# Altium integrated library RL2.IntLib: 663 symbols (part 3 of 4) (continued)
## AD9244 (continued)

## ADA4661-2ARMZ
designator *
footprint MSOP8
part A pins: 1 OUT (out), 2 - (in), 3 + (in), 4 V- (power), 8 V+ (power)
part B pins: 5 + (in), 6 - (in), 7 OUT (out)

## ADCS7476AIMF
designator DD?
1MSPS, 12-/10-/8-Bit A/D Converters in SOT-23 & WSON
footprint SOT23-6  (SOT457) (SC-74)
pins: 1 VDD (power), 2 GND (in), 3 VIN (in), 4 SCK (out), 5 SDO (in), 6 ~{CS} (power)

## ADG604TRU
designator DA?
Part Field 1: *; Part Field 2: *
footprint TSSOP14 (JEDEC MO-153)
pins: 1 A0, 2 EN, 3 VSS, 4 IN0, 5 IN1, 6 OUT, 10 IN3, 11 IN2, 12 VDD, 13 GND, 14 A1
text: MUX

## ADG608TRU
designator DA?
Part Field 1: *; Part Field 2: *
footprint TSSOP16 (JEDEC MO-153)
pins: 1 A0, 2 EN, 3 VSS, 4 IN0, 5 IN1, 6 IN2, 7 IN3, 8 OUT, 9 IN7, 10 IN6, 11 IN5, 12 IN4, 13 VDD, 14 GND, 15 A2, 16 A1
text: MUX

## ADG1421BRMZ
designator DA?
2.1 Ω On Resistance, ±15 V/+12 V/±5 V iCMOS Dual SPST Switches; Part Field 1: *; Part Field 2: *
footprint MSOP10 (MO-187-BA)
pins: 1 S1 (io), 2 S2 (io), 4 GND (power), 5 VDD (power), 6 IN2 (power), 7 IN1 (power), 8 VSS (power), 9 D2 (power), 10 D1 (power)
text: SPST

## ADG1439BRUZ
designator DA?
Serially Controlled, ±15 V/+12 V/±5 V, 4-Channel, iCMOS Multiplexers/Matrix Switches
footprint TSSOP20 (JEDEC MO-153)
pins: 1 SCLK (in), 2 VDD (in), 3 DIN (power), 4 GND (in), 6 S1A (power), 7 S2A (out), 8 S3A (out), 9 S4A (power), 10 DA (power), 11 DB (out), 12 S4B (out), 13 S3B (power), 14 S2B (out), 15 S1B (out), 16 VSS (power), 17 ~{RESET} (out), 18 SDO (in), 19 VL (io), 20 ~{SYNC} (out)

## ADG1606BCPZ
designator DA?
4.5 Om RON, 16-Channel, ±5 V,+12 V,+5 V, and +3.3 V Multiplexer; Part Field 1: *; Part Field 2: *
footprint LFCSP32 (CP-32-2) MO-220-VHHD-2
pins: 1 IN15, 2 IN14, 3 IN13, 4 IN12, 5 IN11, 6 IN10, 7 IN9, 8 IN8, 9 GND, 10 A3, 11 A2, 14 A1, 15 A0, 16 EN, 17 IN0, 18 IN1, 19 IN2, 20 IN3, 21 IN4, 22 IN5, 23 IN6, 24 IN7, 25 VSS, 29 OUT, 31 VDD, 33 PAD
text: MUX

## ADG2188
designator DA?, comment ADG2188BCPZ
I 2C® CMOS 8 × 8 Unbuffered Analog / Switch Array with Dual/Single Supplies
footprint LFCSP32 (CP-32-7) MO-220-WHHD
pins: 1 VSS, 3 X0, 4 X1, 5 X2, 6 X3, 7 X4, 8 X5, 9 Y0, 10 Y1, 11 Y2, 12 Y3, 13 Y4, 14 Y5, 15 Y6, 16 Y7, 17 X6, 18 X7, 24 VDD, 25 VL, 26 SDA, 27 SCL, 28 A0, 29 A1, 30 A2, 31 ~{RESET}, 32 GND, 33 PAD
text: ADC

## ADM809-5SART
designator DD?
footprint SOT-23
pins: 1 GND (in), 2 ~{RST} (in), 3 VCC (in)

## ADR435BR
designator DA?, comment ADR435BRZ
footprint SOIC8 JEDEC
pins: 2 VIN (in), 4 GND (power), 5 TRIM (power), 6 VOUT (power)

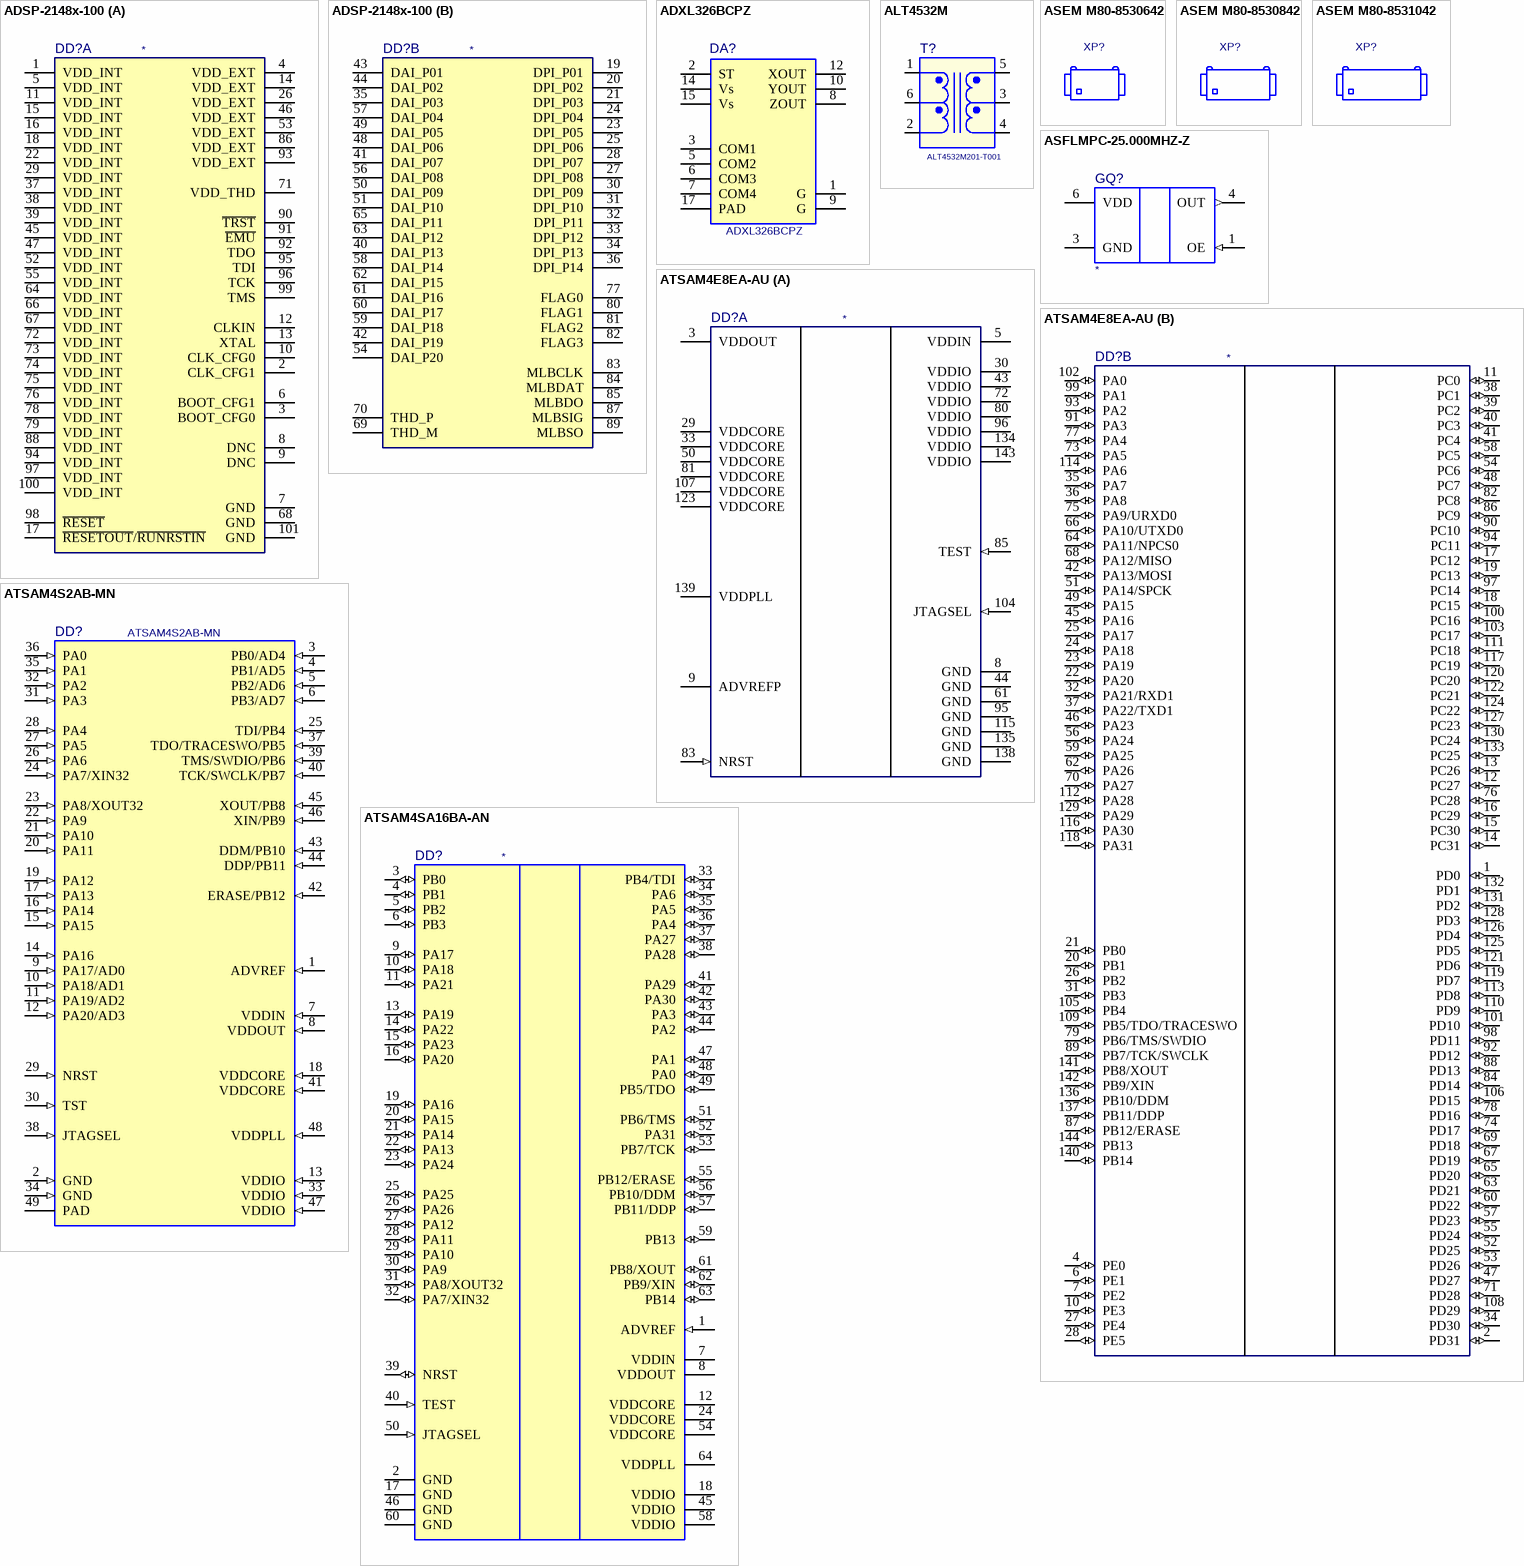
[diagram p23: symbols ADSP-2148x-100 to ATSAM4SA16BA-AN]

## ADSP-2148x-100
designator DD?
footprint LQFP100-25
part A pins: 1 VDD_INT (power), 2 CLK_CFG1 (power), 3 BOOT_CFG0 (power), 4 VDD_EXT (power), 5 VDD_INT (power), 6 BOOT_CFG1 (power), 7 GND (power), 8 DNC (power), 9 DNC (power), 10 CLK_CFG0 (power), 11 VDD_INT (power), 12 CLKIN (power), 13 XTAL (power), 14 VDD_EXT (power), 15 VDD_INT (power), 16 VDD_INT (power), 17 ~{RESETOUT}/~{RUNRSTIN} (power), 18 VDD_INT (power), 22 VDD_INT (power), 26 VDD_EXT (power), 29 VDD_INT (power), 37 VDD_INT (power), 38 VDD_INT (power), 39 VDD_INT (power), 45 VDD_INT (power), 46 VDD_EXT (power), 47 VDD_INT (power), 52 VDD_INT (power), 53 VDD_EXT (power), 55 VDD_INT (power), 64 VDD_INT (power), 66 VDD_INT (power), 67 VDD_INT (power), 68 GND (power), 71 VDD_THD (power), 72 VDD_INT (power), 73 VDD_INT (power), 74 VDD_INT (power), 75 VDD_INT (power), 76 VDD_INT (power), 78 VDD_INT (power), 79 VDD_INT (power), 86 VDD_EXT (power), 88 VDD_INT (power), 90 ~{TRST} (power), 91 ~{EMU} (power), 92 TDO (power), 93 VDD_EXT (power), 94 VDD_INT (power), 95 TDI (power), 96 TCK (power), 97 VDD_INT (power), 98 ~{RESET} (power), 99 TMS (power), 100 VDD_INT (power), 101 GND (power)
part B pins: 19 DPI_P01 (power), 20 DPI_P02 (power), 21 DPI_P03 (power), 23 DPI_P05 (power), 24 DPI_P04 (power), 25 DPI_P06 (power), 27 DPI_P08 (power), 28 DPI_P07 (power), 30 DPI_P09 (power), 31 DPI_P10 (power), 32 DPI_P11 (power), 33 DPI_P12 (power), 34 DPI_P13 (power), 35 DAI_P03 (power), 36 DPI_P14 (power), 40 DAI_P13 (power), 41 DAI_P07 (power), 42 DAI_P19 (power), 43 DAI_P01 (power), 44 DAI_P02 (power), 48 DAI_P06 (power), 49 DAI_P05 (power), 50 DAI_P09 (power), 51 DAI_P10 (power), 54 DAI_P20 (power), 56 DAI_P08 (power), 57 DAI_P04 (power), 58 DAI_P14 (power), 59 DAI_P18 (power), 60 DAI_P17 (power), 61 DAI_P16 (power), 62 DAI_P15 (power), 63 DAI_P12 (power), 65 DAI_P11 (power), 69 THD_M (power), 70 THD_P (power), 77 FLAG0 (power), 80 FLAG1 (power), 81 FLAG2 (power), 82 FLAG3 (power), 83 MLBCLK (power), 84 MLBDAT (power), 85 MLBDO (power), 87 MLBSIG (power), 89 MLBSO (power)
1 alternate drawing of the same symbol

## ADXL326BCPZ
designator DA?
Small, Low Power, 3-Axis ±16 g Accelerometer; Part Field 1: *; Part Field 2: *
footprint LFCSP16 (CP-16-5a)
pins: 1 G, 2 ST, 3 COM1, 5 COM2, 6 COM3, 7 COM4, 8 ZOUT, 9 G, 10 YOUT, 12 XOUT, 14 Vs, 15 Vs, 17 PAD

## ALT4532M
designator T?, comment ALT4532M201-T001
footprint ALT4532M
pins: 1 TD+, 2, 3, 4, 5, 6

## ASEM M80-8530642
designator XP?, comment M80-8530642 вилка на плату  (value not drawn)
M80-8530642; Value: *

## ASEM M80-8530842
designator XP?, comment M80-8530842 вилка на плату  (value not drawn)
M80-8530842; Value: *

## ASEM M80-8531042
designator XP?, comment M80-8531042 вилка на плату  (value not drawn)
M80-8531042; Value: *

## ASFLMPC-25.000MHZ-Z
designator GQ?
footprint ASFLMP
pins: 1 OE (in), 3 GND (power), 4 OUT (out), 6 VDD (power)

## ATSAM4E8EA-AU
designator DD?
footprint LQFP144
signal-integrity model sam4e8e_lqfp144.ibs
part A pins: 3 VDDOUT (power), 5 VDDIN (power), 8 GND (power), 9 ADVREFP (power), 29 VDDCORE (power), 30 VDDIO (power), 33 VDDCORE (power), 43 VDDIO (power), 44 GND (power), 50 VDDCORE (power), 61 GND (power), 72 VDDIO (power), 80 VDDIO (power), 81 VDDCORE (power), 83 NRST (in), 85 TEST (in), 95 GND (power), 96 VDDIO (power), 104 JTAGSEL (in), 107 VDDCORE (power), 115 GND (power), 123 VDDCORE (power), 134 VDDIO (power), 135 GND (power), 138 GND (power), 139 VDDPLL (power), 143 VDDIO (power)
part B pins: 1 PD0 (io), 2 PD31 (io), 4 PE0 (io), 6 PE1 (io), 7 PE2 (io), 10 PE3 (io), 11 PC0 (io), 12 PC27 (io), 13 PC26 (io), 14 PC31 (io), 15 PC30 (io), 16 PC29 (io), 17 PC12 (io), 18 PC15 (io), 19 PC13 (io), 20 PB1 (io), 21 PB0 (io), 22 PA20 (io), 23 PA19 (io), 24 PA18 (io), 25 PA17 (io), 26 PB2 (io), 27 PE4 (io), 28 PE5 (io), 31 PB3 (io), 32 PA21/RXD1 (io), 34 PD30 (io), 35 PA7 (io), 36 PA8 (io), 37 PA22/TXD1 (io), 38 PC1 (io), 39 PC2 (io), 40 PC3 (io), 41 PC4 (io), 42 PA13/MOSI (io), 45 PA16 (io), 46 PA23 (io), 47 PD27 (io), 48 PC7 (io), 49 PA15 (io), 51 PA14/SPCK (io), 52 PD25 (io), 53 PD26 (io), 54 PC6 (io), 55 PD24 (io), 56 PA24 (io), 57 PD23 (io), 58 PC5 (io), 59 PA25 (io), 60 PD22 (io), 62 PA26 (io), 63 PD21 (io), 64 PA11/NPCS0 (io), 65 PD20 (io), 66 PA10/UTXD0 (io), 67 PD19 (io), 68 PA12/MISO (io), 69 PD18 (io), 70 PA27 (io), 71 PD28 (io), 73 PA5 (io), 74 PD17 (io), 75 PA9/URXD0 (io), 76 PC28 (io), 77 PA4 (io), 78 PD16 (io), 79 PB6/TMS/SWDIO (io), 82 PC8 (io), 84 PD14 (io), 86 PC9 (io), 87 PB12/ERASE (io), 88 PD13 (io), 89 PB7/TCK/SWCLK (io), 90 PC10 (io), 91 PA3 (io), 92 PD12 (io), 93 PA2 (io), 94 PC11 (io), 97 PC14 (io), 98 PD11 (io), 99 PA1 (io), 100 PC16 (io), 101 PD10 (io), 102 PA0 (io), 103 PC17 (io), 105 PB4 (io), 106 PD15 (io), 108 PD29 (io), 109 PB5/TDO/TRACESWO (io), 110 PD9 (io), 111 PC18 (io), 112 PA28 (io), 113 PD8 (io), 114 PA6 (io), 116 PA30 (io), 117 PC19 (io), 118 PA31 (io), 119 PD7 (io), 120 PC20 (io), 121 PD6 (io), 122 PC21 (io), 124 PC22 (io), 125 PD5 (io), 126 PD4 (io), 127 PC23 (io), 128 PD3 (io), 129 PA29 (io), 130 PC24 (io), 131 PD2 (io), 132 PD1 (io), 133 PC25 (io), 136 PB10/DDM (io), 137 PB11/DDP (io), 140 PB14 (io), 141 PB8/XOUT (io), 142 PB9/XIN (io), 144 PB13 (io)

## ATSAM4S2AB-MN
designator DD?
footprint QFN48_5.8 (QFN, 64-Leads, Body 9x9mm, Pitch 0.5mm, Thermal Pad 7.3x7.3mm, IPC Low Density)
pins: 1 ADVREF (in), 2 GND (in), 3 PB0/AD4 (in), 4 PB1/AD5 (in), 5 PB2/AD6 (in), 6 PB3/AD7 (in), 7 VDDIN (in), 8 VDDOUT (in), 9 PA17/AD0 (in), 10 PA18/AD1 (in), 11 PA19/AD2 (in), 12 PA20/AD3 (in), 13 VDDIO (in), 14 PA16 (in), 15 PA15 (in), 16 PA14 (in), 17 PA13 (in), 18 VDDCORE (in), 19 PA12 (in), 20 PA11 (in), 21 PA10 (in), 22 PA9 (in), 23 PA8/XOUT32 (in), 24 PA7/XIN32 (in), 25 TDI/PB4 (in), 26 PA6 (in), 27 PA5 (in), 28 PA4 (in), 29 NRST (in), 30 TST (in), 31 PA3 (in), 32 PA2 (in), 33 VDDIO (in), 34 GND (in), 35 PA1 (in), 36 PA0 (in), 37 TDO/TRACESWO/PB5 (in), 38 JTAGSEL (in), 39 TMS/SWDIO/PB6 (in), 40 TCK/SWCLK/PB7 (in), 41 VDDCORE (in), 42 ERASE/PB12 (in), 43 DDM/PB10 (in), 44 DDP/PB11 (in), 45 XOUT/PB8 (in), 46 XIN/PB9 (in), 47 VDDIO (in), 48 VDDPLL (in), 49 PAD (power)

## ATSAM4SA16BA-AN
designator DD?
footprint LQFP64
pins: 1 ADVREF (in), 2 GND (power), 3 PB0 (io), 4 PB1 (io), 5 PB2 (io), 6 PB3 (io), 7 VDDIN (power), 8 VDDOUT (power), 9 PA17 (io), 10 PA18 (io), 11 PA21 (io), 12 VDDCORE (power), 13 PA19 (io), 14 PA22 (io), 15 PA23 (io), 16 PA20 (io), 17 GND (power), 18 VDDIO (power), 19 PA16 (io), 20 PA15 (io), 21 PA14 (io), 22 PA13 (io), 23 PA24 (io), 24 VDDCORE (power), 25 PA25 (io), 26 PA26 (io), 27 PA12 (io), 28 PA11 (io), 29 PA10 (io), 30 PA9 (io), 31 PA8/XOUT32 (io), 32 PA7/XIN32 (io), 33 PB4/TDI (io), 34 PA6 (io), 35 PA5 (io), 36 PA4 (io), 37 PA27 (io), 38 PA28 (io), 39 NRST (io), 40 TEST (in), 41 PA29 (io), 42 PA30 (io), 43 PA3 (io), 44 PA2 (io), 45 VDDIO (power), 46 GND (power), 47 PA1 (io), 48 PA0 (io), 49 PB5/TDO (io), 50 JTAGSEL (in), 51 PB6/TMS (io), 52 PA31 (io), 53 PB7/TCK (io), 54 VDDCORE (power), 55 PB12/ERASE (io), 56 PB10/DDM (io), 57 PB11/DDP (io), 58 VDDIO (power), 59 PB13 (io), 60 GND (power), 61 PB8/XOUT (io), 62 PB9/XIN (io), 63 PB14 (io), 64 VDDPLL (power)

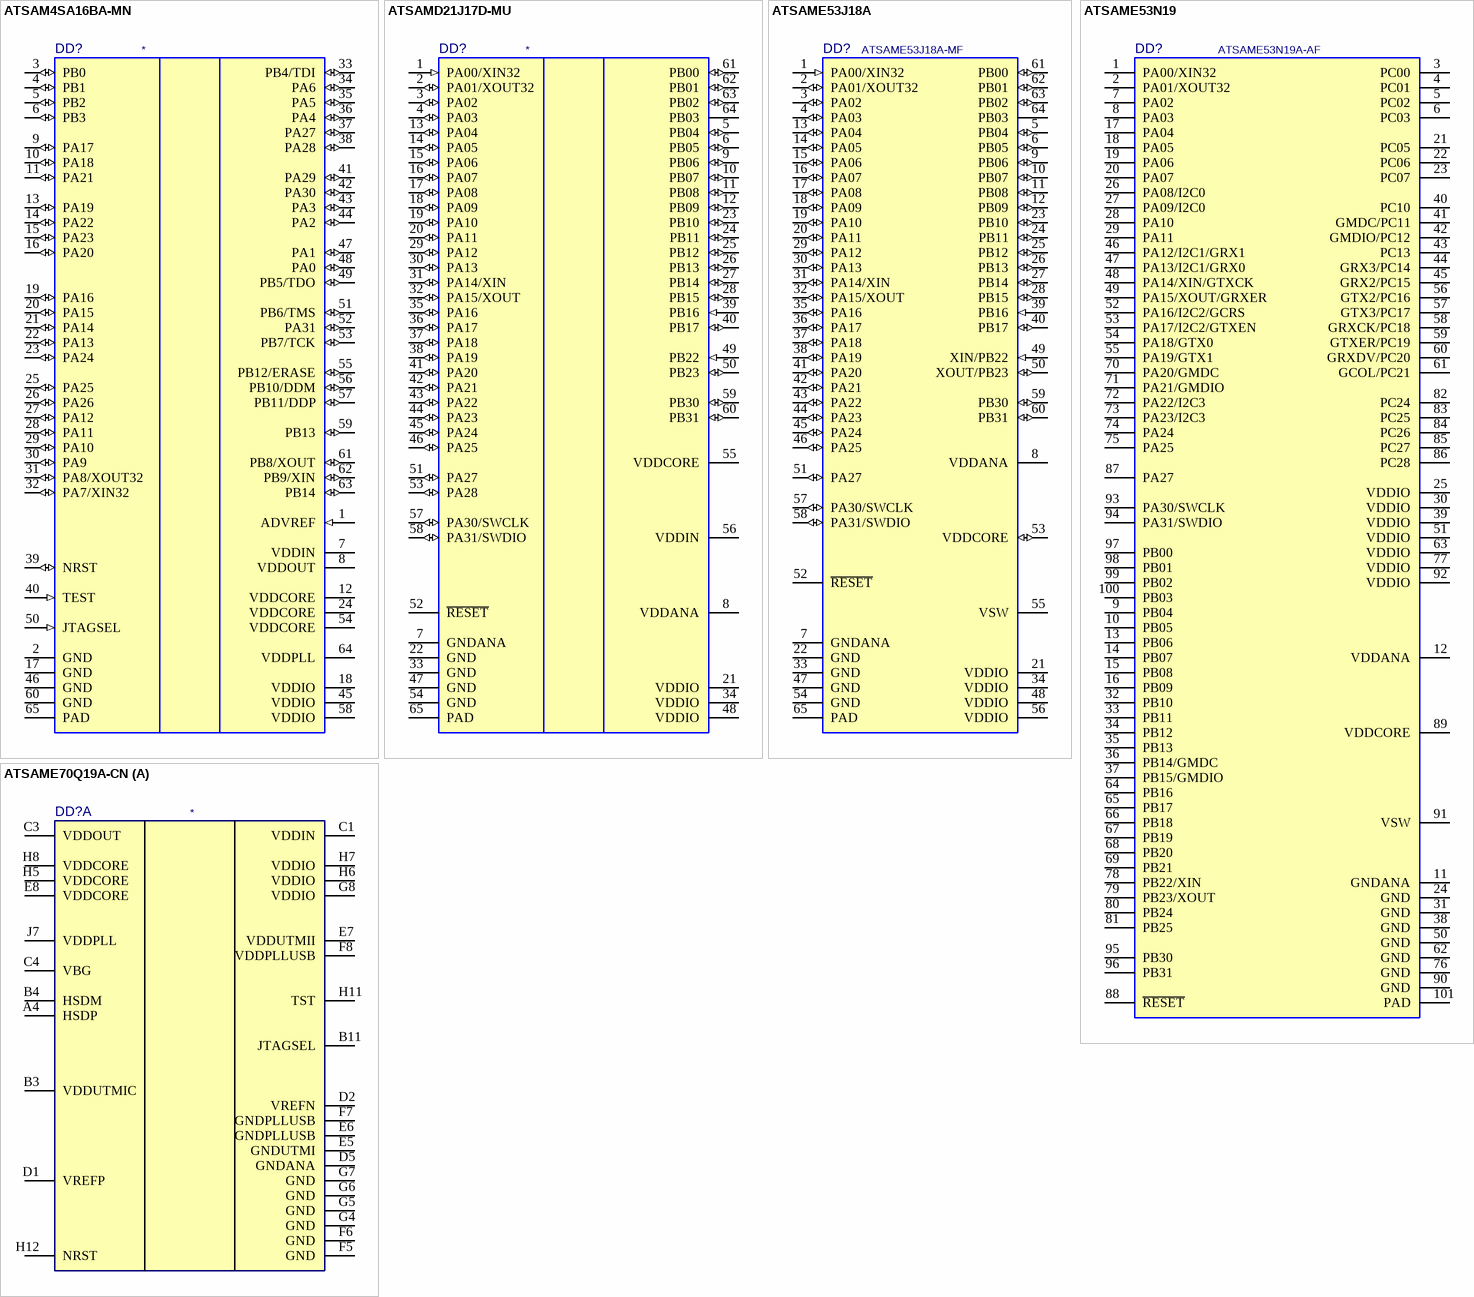
[diagram p24: symbols ATSAM4SA16BA-MN to ATSAME70Q19A-CN]

## ATSAM4SA16BA-MN
designator DD?
footprint QFN64 (QFN, 64-Leads, Body 9x9mm, Pitch 0.5mm, Thermal Pad 7.3x7.3mm, IPC Low Density)
pins: 1 ADVREF (in), 2 GND (power), 3 PB0 (io), 4 PB1 (io), 5 PB2 (io), 6 PB3 (io), 7 VDDIN (power), 8 VDDOUT (power), 9 PA17 (io), 10 PA18 (io), 11 PA21 (io), 12 VDDCORE (power), 13 PA19 (io), 14 PA22 (io), 15 PA23 (io), 16 PA20 (io), 17 GND (power), 18 VDDIO (power), 19 PA16 (io), 20 PA15 (io), 21 PA14 (io), 22 PA13 (io), 23 PA24 (io), 24 VDDCORE (power), 25 PA25 (io), 26 PA26 (io), 27 PA12 (io), 28 PA11 (io), 29 PA10 (io), 30 PA9 (io), 31 PA8/XOUT32 (io), 32 PA7/XIN32 (io), 33 PB4/TDI (io), 34 PA6 (io), 35 PA5 (io), 36 PA4 (io), 37 PA27 (io), 38 PA28 (io), 39 NRST (io), 40 TEST (in), 41 PA29 (io), 42 PA30 (io), 43 PA3 (io), 44 PA2 (io), 45 VDDIO (power), 46 GND (power), 47 PA1 (io), 48 PA0 (io), 49 PB5/TDO (io), 50 JTAGSEL (in), 51 PB6/TMS (io), 52 PA31 (io), 53 PB7/TCK (io), 54 VDDCORE (power), 55 PB12/ERASE (io), 56 PB10/DDM (io), 57 PB11/DDP (io), 58 VDDIO (power), 59 PB13 (io), 60 GND (power), 61 PB8/XOUT (io), 62 PB9/XIN (io), 63 PB14 (io), 64 VDDPLL (power), 65 PAD (power)
1 alternate drawing of the same symbol

## ATSAMD21J17D-MU
designator DD?
footprint VQFN64_4.7 (QFN, 64-Leads, Body 9x9mm, Pitch 0.5mm, Thermal Pad 4.7x4.7mm, IPC Low Density)
pins: 1 PA00/XIN32 (in), 2 PA01/XOUT32 (io), 3 PA02 (io), 4 PA03 (io), 5 PB04 (io), 6 PB05 (io), 7 GNDANA (power), 8 VDDANA (power), 9 PB06 (io), 10 PB07 (io), 11 PB08 (io), 12 PB09 (io), 13 PA04 (io), 14 PA05 (io), 15 PA06 (io), 16 PA07 (io), 17 PA08 (io), 18 PA09 (io), 19 PA10 (io), 20 PA11 (io), 21 VDDIO (power), 22 GND (power), 23 PB10 (io), 24 PB11 (io), 25 PB12 (io), 26 PB13 (io), 27 PB14 (io), 28 PB15 (io), 29 PA12 (io), 30 PA13 (io), 31 PA14/XIN (io), 32 PA15/XOUT (io), 33 GND (power), 34 VDDIO (power), 35 PA16 (io), 36 PA17 (io), 37 PA18 (io), 38 PA19 (io), 39 PB16 (in), 40 PB17 (io), 41 PA20 (io), 42 PA21 (io), 43 PA22 (io), 44 PA23 (io), 45 PA24 (io), 46 PA25 (io), 47 GND (power), 48 VDDIO (power), 49 PB22 (in), 50 PB23 (io), 51 PA27 (io), 52 ~{RESET} (power), 53 PA28 (io), 54 GND (power), 55 VDDCORE (power), 56 VDDIN (power), 57 PA30/SWCLK (io), 58 PA31/SWDIO (io), 59 PB30 (io), 60 PB31 (io), 61 PB00 (io), 62 PB01 (io), 63 PB02 (io), 64 PB03 (power), 65 PAD (power)

## ATSAME53J18A
designator DD?, comment ATSAME53J18A-MF
footprint VQFN64_4.7 (QFN, 64-Leads, Body 9x9mm, Pitch 0.5mm, Thermal Pad 4.7x4.7mm, IPC Low Density)
pins: 1 PA00/XIN32 (in), 2 PA01/XOUT32 (io), 3 PA02 (io), 4 PA03 (io), 5 PB04 (io), 6 PB05 (io), 7 GNDANA (power), 8 VDDANA (power), 9 PB06 (io), 10 PB07 (io), 11 PB08 (io), 12 PB09 (io), 13 PA04 (io), 14 PA05 (io), 15 PA06 (io), 16 PA07 (io), 17 PA08 (io), 18 PA09 (io), 19 PA10 (io), 20 PA11 (io), 21 VDDIO (power), 22 GND (power), 23 PB10 (io), 24 PB11 (io), 25 PB12 (io), 26 PB13 (io), 27 PB14 (io), 28 PB15 (io), 29 PA12 (io), 30 PA13 (io), 31 PA14/XIN (io), 32 PA15/XOUT (io), 33 GND (power), 34 VDDIO (power), 35 PA16 (io), 36 PA17 (io), 37 PA18 (io), 38 PA19 (io), 39 PB16 (in), 40 PB17 (io), 41 PA20 (io), 42 PA21 (io), 43 PA22 (io), 44 PA23 (io), 45 PA24 (io), 46 PA25 (io), 47 GND (power), 48 VDDIO (power), 49 XIN/PB22 (in), 50 XOUT/PB23 (io), 51 PA27 (io), 52 ~{RESET} (power), 53 VDDCORE (io), 54 GND (power), 55 VSW (power), 56 VDDIO (power), 57 PA30/SWCLK (io), 58 PA31/SWDIO (io), 59 PB30 (io), 60 PB31 (io), 61 PB00 (io), 62 PB01 (io), 63 PB02 (io), 64 PB03 (power), 65 PAD (power)

## ATSAME53N19
designator DD?, comment ATSAME53N19A-AF
footprint LQFP100-TPAD
pins: 1 PA00/XIN32 (power), 2 PA01/XOUT32 (power), 3 PC00 (power), 4 PC01 (power), 5 PC02 (power), 6 PC03 (power), 7 PA02 (power), 8 PA03 (power), 9 PB04 (power), 10 PB05 (power), 11 GNDANA (power), 12 VDDANA (power), 13 PB06 (power), 14 PB07 (power), 15 PB08 (power), 16 PB09 (power), 17 PA04 (power), 18 PA05 (power), 19 PA06 (power), 20 PA07 (power), 21 PC05 (power), 22 PC06 (power), 23 PC07 (power), 24 GND (power), 25 VDDIO (power), 26 PA08/I2C0 (power), 27 PA09/I2C0 (power), 28 PA10 (power), 29 PA11 (power), 30 VDDIO (power), 31 GND (power), 32 PB10 (power), 33 PB11 (power), 34 PB12 (power), 35 PB13 (power), 36 PB14/GMDC (power), 37 PB15/GMDIO (power), 38 GND (power), 39 VDDIO (power), 40 PC10 (power), 41 GMDC/PC11 (power), 42 GMDIO/PC12 (power), 43 PC13 (power), 44 GRX3/PC14 (power), 45 GRX2/PC15 (power), 46 PA12/I2C1/GRX1 (power), 47 PA13/I2C1/GRX0 (power), 48 PA14/XIN/GTXCK (power), 49 PA15/XOUT/GRXER (power), 50 GND (power), 51 VDDIO (power), 52 PA16/I2C2/GCRS (power), 53 PA17/I2C2/GTXEN (power), 54 PA18/GTX0 (power), 55 PA19/GTX1 (power), 56 GTX2/PC16 (power), 57 GTX3/PC17 (power), 58 GRXCK/PC18 (power), 59 GTXER/PC19 (power), 60 GRXDV/PC20 (power), 61 GCOL/PC21 (power), 62 GND (power), 63 VDDIO (power), 64 PB16 (power), 65 PB17 (power), 66 PB18 (power), 67 PB19 (power), 68 PB20 (power), 69 PB21 (power), 70 PA20/GMDC (power), 71 PA21/GMDIO (power), 72 PA22/I2C3 (power), 73 PA23/I2C3 (power), 74 PA24 (power), 75 PA25 (power), 76 GND (power), 77 VDDIO (power), 78 PB22/XIN (power), 79 PB23/XOUT (power), 80 PB24 (power), 81 PB25 (power), 82 PC24 (power), 83 PC25 (power), 84 PC26 (power), 85 PC27 (power), 86 PC28 (power), 87 PA27 (power), 88 ~{RESET} (power), 89 VDDCORE (power), 90 GND (power), 91 VSW (power), 92 VDDIO (power), 93 PA30/SWCLK (power), 94 PA31/SWDIO (power), 95 PB30 (power), 96 PB31 (power), 97 PB00 (power), 98 PB01 (power), 99 PB02 (power), 100 PB03 (power), 101 PAD (power)

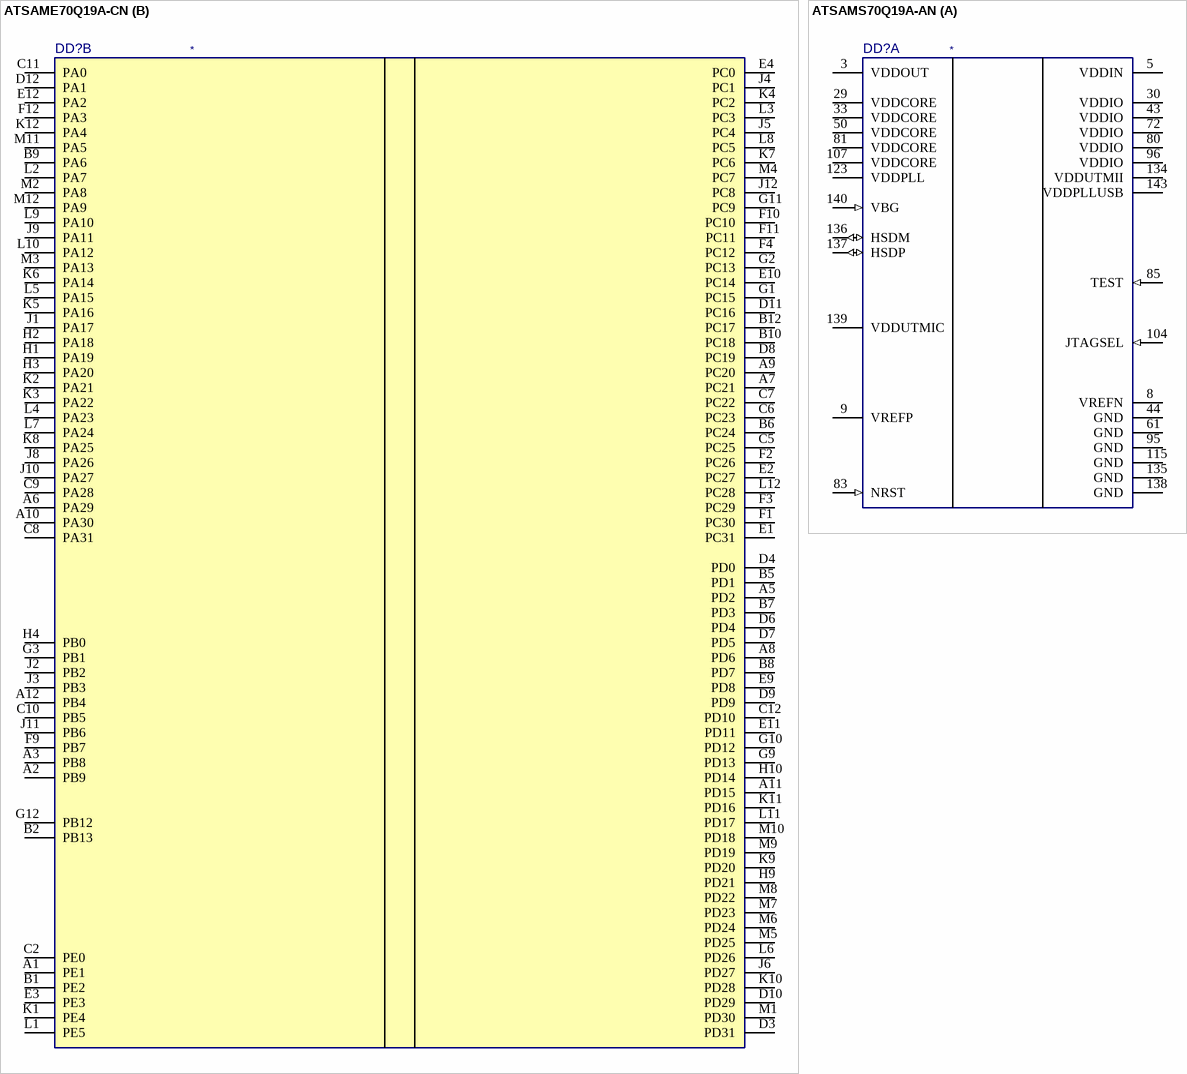
[diagram p25: symbols ATSAME70Q19A-CN to ATSAMS70Q19A-AN]

## ATSAME70Q19A-CN
designator DD?
footprint LFBGA144 (BGA, 144-Leads, Body 10x10mm, Pitch 0.8mm)
part A pins: A4 HSDP, B3 VDDUTMIC, B4 HSDM, B11 JTAGSEL, C1 VDDIN, C3 VDDOUT, C4 VBG, D1 VREFP, D2 VREFN, D5 GNDANA, E5 GNDUTMI, E6 GNDPLLUSB, E7 VDDUTMII, E8 VDDCORE, F5 GND, F6 GND, F7 GNDPLLUSB, F8 VDDPLLUSB, G4 GND, G5 GND, G6 GND, G7 GND, G8 VDDIO, H5 VDDCORE, H6 VDDIO, H7 VDDIO, H8 VDDCORE, H11 TST, H12 NRST, J7 VDDPLL
part B pins: A1 PE1, A2 PB9, A3 PB8, A5 PD2, A6 PA29, A7 PC21, A8 PD6, A9 PC20, A10 PA30, A11 PD15, A12 PB4, B1 PE2, B2 PB13, B5 PD1, B6 PC24, B7 PD3, B8 PD7, B9 PA6, B10 PC18, B12 PC17, C2 PE0, C5 PC25, C6 PC23, C7 PC22, C8 PA31, C9 PA28, C10 PB5, C11 PA0, C12 PD10, D3 PD31, D4 PD0, D6 PD4, D7 PD5, D8 PC19, D9 PD9, D10 PD29, D11 PC16, D12 PA1, E1 PC31, E2 PC27, E3 PE3, E4 PC0, E9 PD8, E10 PC14, E11 PD11, E12 PA2, F1 PC30, F2 PC26, F3 PC29, F4 PC12, F9 PB7, F10 PC10, F11 PC11, F12 PA3, G1 PC15, G2 PC13, G3 PB1, G9 PD13, G10 PD12, G11 PC9, G12 PB12, H1 PA19, H2 PA18, H3 PA20, H4 PB0, H9 PD21, H10 PD14, J1 PA17, J2 PB2, J3 PB3, J4 PC1, J5 PC4, J6 PD27, J8 PA26, J9 PA11, J10 PA27, J11 PB6, J12 PC8, K1 PE4, K2 PA21, K3 PA22, K4 PC2, K5 PA16, K6 PA14, K7 PC6, K8 PA25, K9 PD20, K10 PD28, K11 PD16, K12 PA4, L1 PE5, L2 PA7, L3 PC3, L4 PA23, L5 PA15, L6 PD26, L7 PA24, L8 PC5, L9 PA10, L10 PA12, L11 PD17, L12 PC28, M1 PD30, M2 PA8, M3 PA13, M4 PC7, M5 PD25, M6 PD24, M7 PD23, M8 PD22, M9 PD19, M10 PD18, M11 PA5, M12 PA9
